# Altium footprint library STM32_1_PcbLib1.PcbLib: 40 footprints (part 2 of 3)
Each footprint in its own frame and in the unit in brackets; x right, y up, seen from the top. Pads: shape width x height; smd on the part's side, far side on the other; paste and mask are expansions set on the pad; w line width, h text height; cw(c..) or ccw(c..) is an arc to the next point about the centre after c.
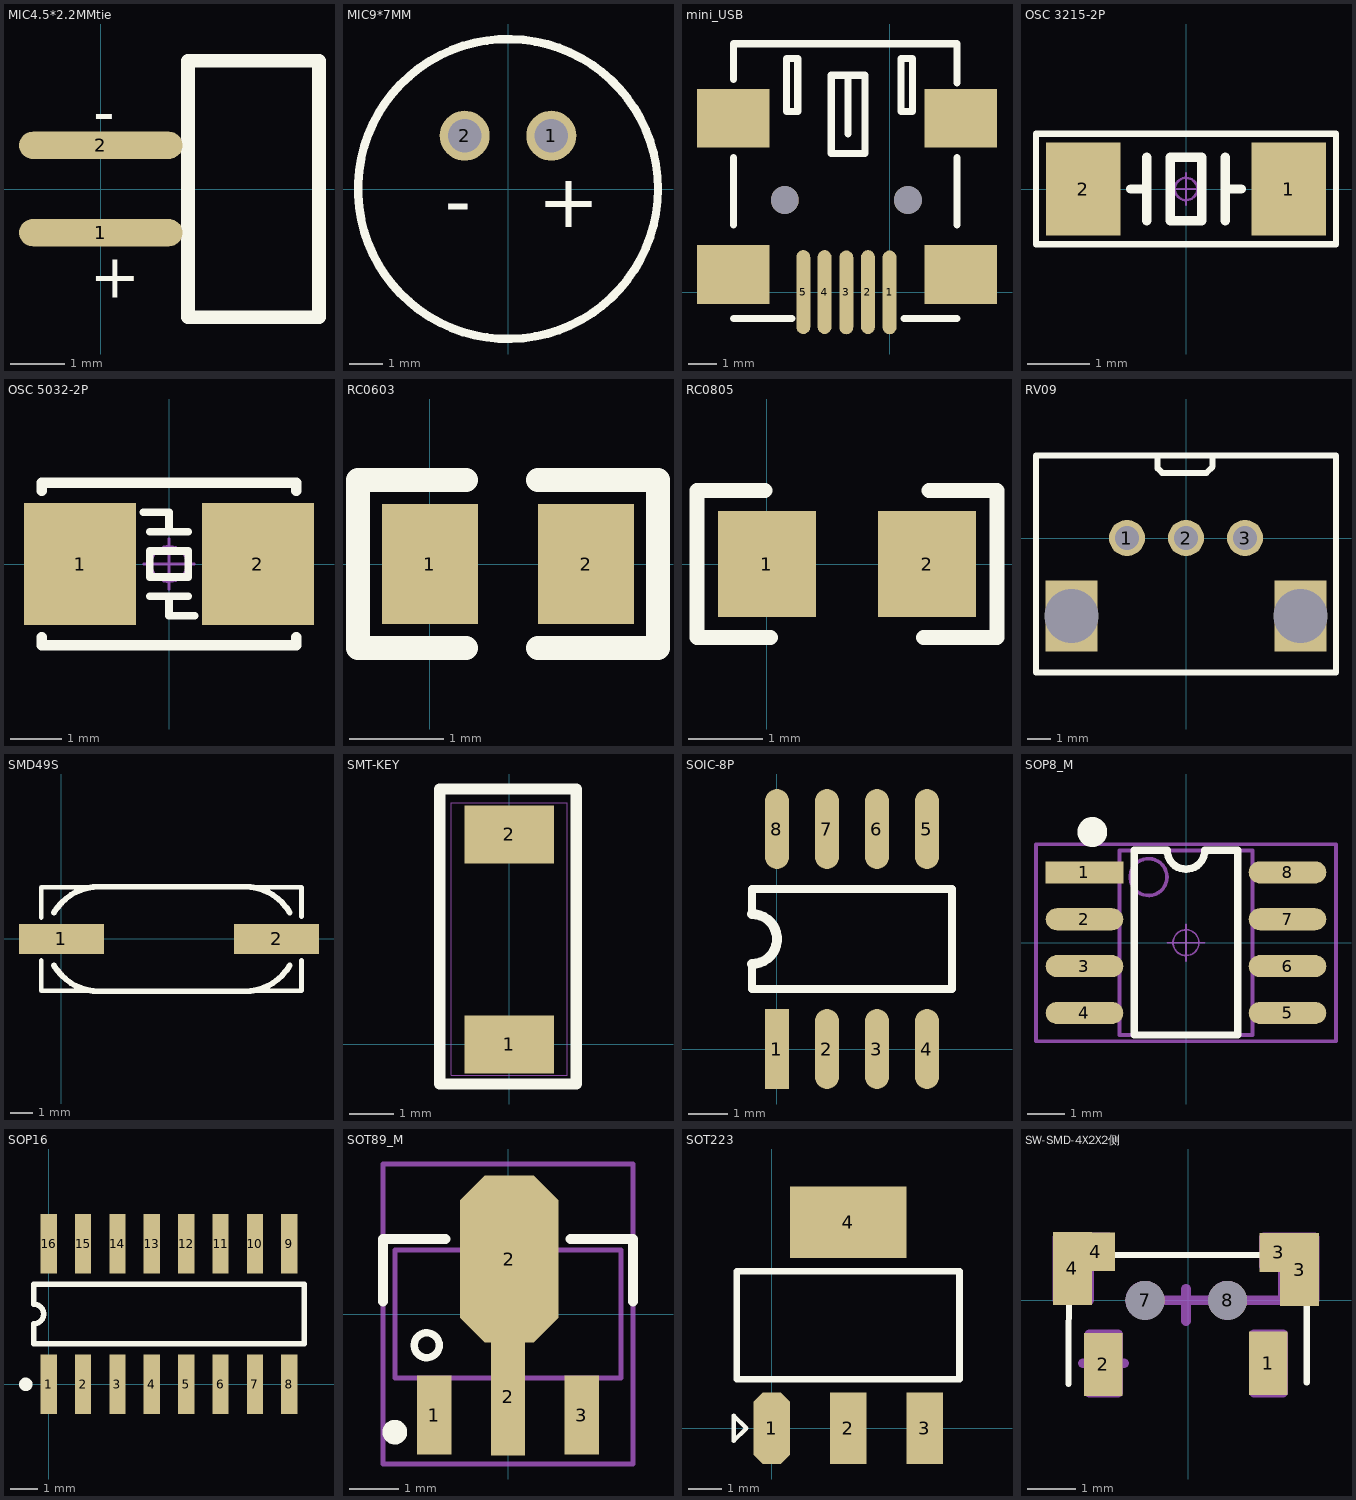
[diagram p1: the footprints below, top view; thin cyan lines are the x and y axes]

## MIC4.5*2.2MMtie [mm]
pads (2):
  oval 3x0.5 smd: 1(0,-0.8) 2(0,0.8)
Top Overlay:
  lines w0.254: 1.6,-2.35 4,-2.35 4,2.35 1.6,2.35 1.6,0 1.6,-2.35
  text "+" at -0.2,-1.99 h0.81
  text "-" at -0.14,1.02 h0.81
3D body: height 3.3, standoff -1.5, extent 1.53,-2.42 3.93,2.38

## MIC9*7MM [mm]
pads (2):
  round 1.5 hole 1: 1(1.3,1.6) 2(-1.3,1.6)
Top Overlay:
  circle w0.254: c0,0 r4.5
  text "+" at 0.889,-1.143 h1.63
  text "-" at -1.905,-1.143 h1.63

## mini_USB [mm]
pads (11):
  oval 0.5x3 smd: 1(0,0) 2(-0.775,0.009) 3(-1.549,0) 4(-2.324,0.009) 5(-3.086,0.009)
  rect 2.6x2.1 smd: ""(-5.588,0.635) ""(-5.588,6.223) ""(2.54,0.635) ""(2.54,6.223)
  round 1 hole 1: ""(-3.749,3.299) ""(0.651,3.299)
Top Overlay:
  lines w0.254: -5.588,2.413 -5.588,4.826 ; -5.586,-0.938 -3.486,-0.938 ; -5.586,7.62 -5.586,8.89 2.414,8.89 2.414,7.493 ; -1.486,5.662 -1.486,7.762 ; 0.514,-0.938 2.414,-0.938 ; 2.413,2.413 2.413,4.826 ; -3.686,6.462 -3.286,6.462 -3.286,8.362 -3.686,8.362 -3.686,6.462 ; -2.086,4.962 -2.086,7.762 -0.886,7.762 -0.886,4.962 -2.086,4.962 ; 0.414,6.462 0.814,6.462 0.814,8.362 0.414,8.362 0.414,6.462

## OSC 3215-2P [mm] "3.2*1.5*0.6mm(长宽高)"
pads (2):
  rect 1.2x1.5 smd: 1(1.65,0) 2(-1.65,0)
Top Overlay:
  lines w0.1: -2.413,-0.889 -2.413,0.889 2.413,0.889 2.413,-0.889 -2.413,-0.889
  lines w0.152: -0.889,0 -0.635,0 ; -0.635,-0.508 -0.635,0.508 ; 0.635,-0.508 0.635,0.508 ; 0.635,0 0.889,0 ; -0.254,-0.508 0.254,-0.508 0.254,0.508 -0.254,0.508 -0.254,-0.508
Mechanical 15:
  circle w0.04: c0,0 r0.18
  lines w0.04: -0.254,0 0.254,0 ; 0,-0.254 0,0.254
3D body "OSC 3215-2.STEP": height 0.61, standoff -0.01, extent -1.6,-0.75 1.6,0.75

## OSC 5032-2P [mm] "5mm*3.2mm*0.8mm(长*宽*高)"
pads (2):
  rect 2.2x2.4 smd: 1(-1.75,0) 2(1.75,0)
Top Overlay:
  lines w0.152: -0.508,1.016 0,1.016 0,0.635 ; -0.381,-0.635 0.381,-0.635 ; -0.381,0.635 0.381,0.635 ; 0,-0.635 0,-1.016 0.381,-1.016 0.508,-1.016 ; -0.381,-0.254 0.381,-0.254 0.381,0.254 -0.381,0.254 -0.381,-0.254
  lines w0.203: -2.5,-1.437 -2.5,-1.6 2.5,-1.6 2.5,-1.437 ; -2.5,1.437 -2.5,1.6 2.5,1.6 2.5,1.437
Mechanical 15:
  circle w0.05: c0,0 r0.35
  lines w0.05: -0.5,0 0.5,0 ; 0,-0.5 0,0.5
3D body: height 1.56, standoff 0, extent -2.5,-1.6 2.5,1.6

## RC0603 [mil]
pads (2):
  rect 40x50 smd: 1(0,0) 2(65,0)
Top Overlay:
  lines w10: 15,-35 -30,-35 -30,35 15,35 ; 45,-35 95,-35 95,35 45,35
3D body "RES0603.STEP": height 17.72, standoff 0, extent 0.79,-16.92 63.79,15.36

## RC0805 [mil]
pads (2):
  rect 52x56 smd: 1(0,0) 2(85,0)
Top Overlay:
  lines w8: -1,39 -37,39 -37,-39 2,-39 ; 83,-39 122,-39 122,39 86,39
3D body "RES0805.STEP": height 15.75, standoff -0.39, extent 3.54,-25.98 82.28,23.23

## RV09 [mm]
pads (5):
  round 1.524 hole 1: 1(-2.5,0) 2(0,0) 3(2.5,0)
  rect 2.2x3 hole 2.3 square: ""(-4.85,-3.3) ""(4.85,-3.3)
Top Overlay:
  lines w0.254: -1.2,3.43 -1.2,2.95 -1.01,2.76 -0.01,2.76 0.87,2.76 1.13,3.02 1.13,3.39 ; -6.35,-5.7 -6.35,-3.3 -6.35,3.5 6.35,3.5 6.35,-3.3 6.35,-5.7 -6.35,-5.7

## SMD49S [mil]
pads (2):
  rect 146x51 smd: 1(0,0) 2(370,0)
Top Overlay:
  lines w8: -35,-37 -35,-89 413,-89 413,-37 ; -35,37 -35,89 413,89 413,38
  lines w10: -12.57,-45.63 ccw(c65,0) 65,-90 315,-90 ccw(c315,0) 392.57,-45.63 ; -12.57,45.63 cw(c65,0) 65,90 ; 55,90 315,90 cw(c315,0) 392.57,45.63

## SMT-KEY [mm]
pads (2):
  rect 2x1.3 smd paste+0 mask+0.2: 1(0,0) 2(0,4.7)
Top Overlay:
  lines w0.254: -1.56,-0.888 -1.56,5.716 1.5,5.716 1.5,-0.888 -1.56,-0.888
Mechanical 13:
  lines w0.003: -1.3,-0.695 1.3,-0.695 1.3,5.405 -1.3,5.405 -1.3,-0.695
  lines w0.025: -1.3,-0.695 1.3,-0.695 1.3,5.405 -1.3,5.405 -1.3,-0.695
3D body "Pushbutton3x4x2.STEP": height 2, standoff 0, extent -1.43,-0.06 1.47,4.84

## SOIC-8P [mil]
pads (8):
  rect 24x80 smd mask+3: 1(0,0)
  oval 24x80 smd mask+3: 2(50,0) 3(100,0) 4(150,0) 5(150,220) 6(100,220) 7(50,220) 8(0,220)
Top Overlay:
  lines w8: -25,85 -25,60 175,60 175,160 -25,160 -25,135
  lines w10: -25,85 ccw(c-25,110) -25,135

## SOP8_M [mm] "5*6*1.8mm（长宽高）"
height 1.75
pads (8):
  rect 2.1x0.6 smd: 1(-2.75,1.905)
  oval 2.1x0.6 smd: 2(-2.75,0.635) 3(-2.75,-0.635) 4(-2.75,-1.905) 5(2.75,-1.905) 6(2.75,-0.635) 7(2.75,0.635) 8(2.75,1.905)
Top Overlay:
  circle w0.5: c-2.54,3 r0.155
  lines w0.2: -1.397,2.5 -1.397,-2.5 1.397,-2.5 1.397,2.5
  lines w0.203: -1.397,2.5 -0.508,2.5 ccw(c0,2.5) 0,1.992 ccw(c0,2.5) 0.508,2.5 1.397,2.5
Mechanical 13:
  circle w0.1: c-1.016,1.778 r0.5
  lines w0.1: -1.8,-2.5 -1.8,2.5 1.8,2.5 1.8,-2.5 -1.8,-2.5
Mechanical 15:
  circle w0.05: c0,0 r0.35
  lines w0.05: -0.5,0 0.5,0 ; 0,-0.5 0,0.5
  lines w0.1: -4.064,-2.667 -4.064,2.667 4.064,2.667 4.064,-2.667 -4.064,-2.667
3D body "SOP8.STEP": height 1.9, standoff 0, extent -3.003,-2.5 3.003,2.5

## SOP16 [mm]
pads (16):
  rect 0.6x2.2 smd: 1(0,0) 2(1.27,0) 3(2.54,0) 4(3.81,0) 5(5.08,0) 6(6.35,0) 7(7.62,0) 8(8.89,0) 9(8.89,5.2) 10(7.62,5.2) 11(6.35,5.2) 12(5.08,5.2) 13(3.81,5.2) 14(2.54,5.2) 15(1.27,5.2) 16(0,5.2)
Top Overlay:
  circle w0.25: c-0.85,0 r0.125
  lines w0.2: -0.555,1.5 9.445,1.5 9.445,3.7 -0.555,3.7 -0.555,2.967 cw(c-0.555,2.6) -0.555,2.233 -0.555,1.5

## SOT89_M [mm] "4.6x4.3x1.6mm(长宽高)"
height 1.6
pads (4):
  rect 0.7x1.6 smd: 1(-1.5,-2.054) 3(1.5,-2.054)
  rect 0.7x2.4 smd: 2(0,-1.676)
  oct 2x3.4 smd: 2(0.025,1.118)
Top Overlay:
  circle w0.25: c-2.3,-2.4 r0.125
  circle w0.15: c-1.651,-0.635 r0.254
  lines w0.2: -2.54,0.254 -2.54,1.524 -1.27,1.524 ; 1.27,1.524 2.54,1.524 2.54,0.254
Mechanical 13:
  circle w0.1: c-1.651,-0.635 r0.25
  lines w0.1: -2.3,-1.3 2.3,-1.3 2.3,1.3 -2.3,1.3 -2.3,-1.3
Mechanical 15:
  circle w0.05: c0,0 r0.35
  lines w0.05: -0.5,0 0.5,0 ; 0,-0.5 0,0.5
  lines w0.1: -2.54,-3.048 -2.54,3.048 2.54,3.048 2.54,-3.048 -2.54,-3.048
3D body "SOT89.STEP": height 1.6, standoff 0.04, extent -2.3,-2.4 2.3,1.9

## SOT223 [mm]
pads (4):
  oct 1.1x2.15 smd: 1(0,0)
  rect 1.1x2.15 smd: 2(2.3,0) 3(4.6,0)
  rect 3.5x2.15 smd: 4(2.3,6.2)
Top Overlay:
  lines w0.127: -1.143,-0.381 -1.143,0.381 -0.762,0 -1.143,-0.381
  lines w0.2: -1.05,1.475 5.65,1.475 5.65,4.725 -1.05,4.725 -1.05,1.475

## SW-SMD-4X2X2侧 [mm] "TS-018/TS-A002 /THAM04"
pads (8):
  rect 0.8x1.3 smd mask+0: 1(1.646,-1.301) 2(-1.758,-1.327)
  rect 0.8x0.8 smd mask+0: 3(1.862,0.985) 4(-1.91,0.997)
  rect 0.8x1.5 smd mask+0: 3(2.293,0.629) 4(-2.393,0.654)
  round 0.8 hole 0.8 mask+0: 7(-0.893,-0.006) 8(0.807,-0.006)
Top Overlay:
  lines w0.127: -2.47,-1.73 -2.46,0.93 2.44,0.93 2.44,-1.7
Mechanical 3:
  circle w0.2: c0.802,-0.003 r0.3
  circle w0.2: c-0.898,-0.003 r0.3
  lines w0.2: -2.181,-1.303 -1.32,-1.303 ; -0.898,-0.003 1.952,-0.003 ; -0.048,-0.429 -0.048,0.236 ; -2.048,1.297 -2.048,0.697 -1.648,0.697 -1.648,1.297 -2.048,1.297 ; -2.048,1.297 -2.048,-0.003 -2.698,-0.003 -2.698,1.297 -2.048,1.297 ; 1.952,-0.003 2.602,-0.003 2.602,1.297 1.952,1.297 ; 1.952,-0.003 1.952,1.297 ; 1.952,1.297 1.552,1.297 1.552,0.697 1.952,0.697 1.952,1.297 ; -2.048,-1.903 -1.448,-1.903 -1.448,-0.703 -2.048,-0.703 -2.048,-1.903 ; 1.352,-1.903 1.952,-1.903 1.952,-0.703 1.352,-0.703 1.352,-1.903
3D body "2X4.STEP": height 1.8, standoff -0.4, extent -2.38,-1.746 2.37,2.054